# Altium footprint library distance_sensor_v2.PcbLib: 32 footprints (part 2 of 2)
Each footprint in its own frame and in the unit in brackets; x right, y up, seen from the top. Pads: shape width x height; smd on the part's side, far side on the other; paste and mask are expansions set on the pad; w line width, h text height; cw(c..) or ccw(c..) is an arc to the next point about the centre after c.
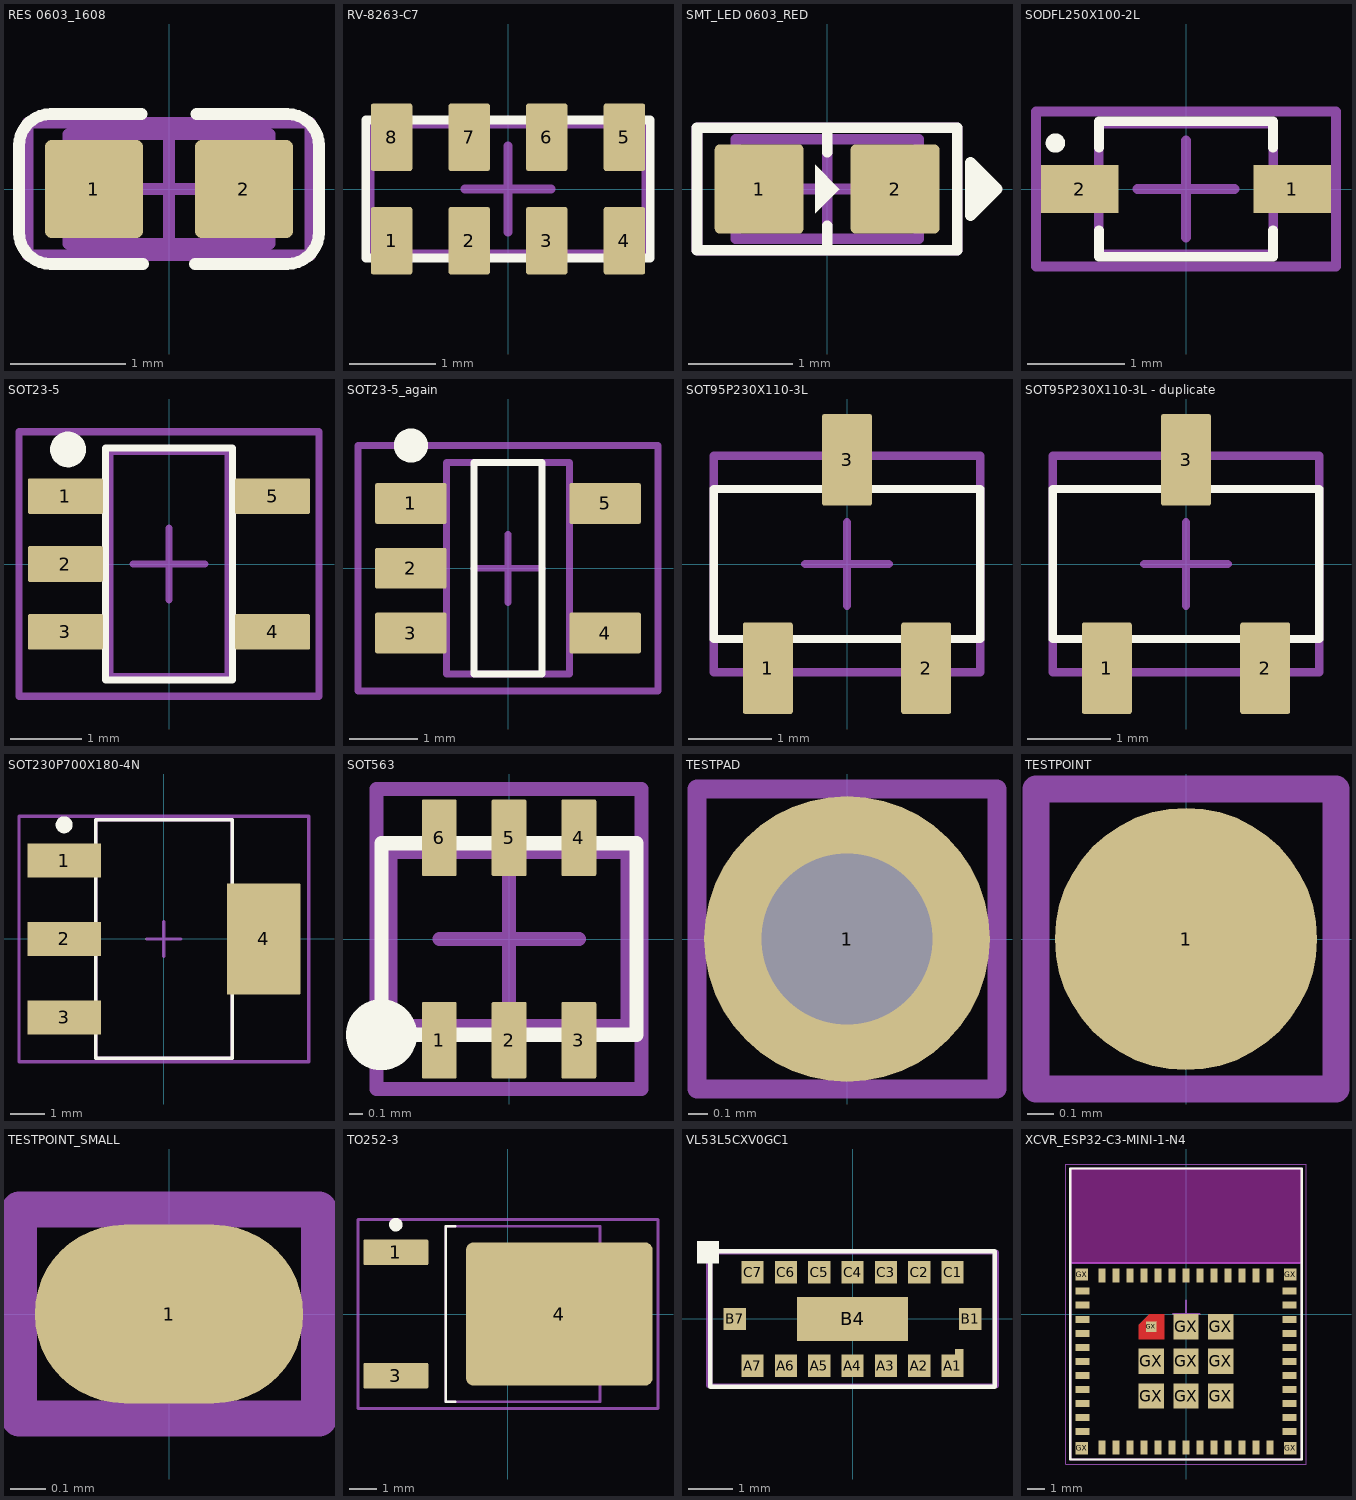
[diagram p1: the footprints below, top view; thin cyan lines are the x and y axes]

## RES 0603_1608 [mm] "Chip Resistor, 2-Leads, Body 1.60x0.80mm, IPC Medium Density"
height 0.45
pads (2):
  rrect12% 0.848x0.848 smd: 1(-0.65,0) 2(0.65,0)
Top Overlay:
  lines w0.102: -0.238,0.65 -1.025,0.65 ccw(c-1.025,0.375) -1.3,0.375 -1.3,-0.375 ccw(c-1.025,-0.375) -1.025,-0.65 -0.225,-0.65 ; 0.225,-0.65 1.025,-0.65 ccw(c1.025,-0.375) 1.3,-0.375 1.3,0.375 ccw(c1.025,0.375) 1.025,0.65 0.238,0.65
Top Assembly:
  lines w0.1: -0.875,-0.475 -0.875,0.475 0.875,0.475 0.875,-0.475 -0.875,-0.475
Top Courtyard:
  lines w0.102: -0.475,0 0.475,0 ; 0,-0.475 0,0.475 ; -1.225,-0.575 -1.225,0.575 1.225,0.575 1.225,-0.575 -1.225,-0.575
3D body "0603 resistor.STEP": height 0.45, standoff 0, extent -0.8,-0.4 0.8,0.4

## RV-8263-C7 [mm] "Real-Time Clock Module"
pads (8):
  rrect10% 0.48x0.78 smd mask+0.076: 1(-1.35,-0.6) 2(-0.45,-0.6) 3(0.45,-0.6) 4(1.35,-0.6) 5(1.35,0.6) 6(0.45,0.6) 7(-0.45,0.6) 8(-1.35,0.6)
Top Overlay:
  lines w0.102: -1.65,-0.8 1.65,-0.8 1.65,0.8 -1.65,0.8 -1.65,-0.8
Top Assembly:
  lines w0.102: -1.6,-0.75 1.6,-0.75 1.6,0.75 -1.6,0.75 -1.6,-0.75
Top Courtyard:
  lines w0.102: -0.5,0 0.5,0 ; 0,-0.5 0,0.5 ; -1.6,-0.75 1.6,-0.75 1.6,0.75 -1.6,0.75 -1.6,-0.75
3D body: height 0.8, standoff 0, extent -1.6,-0.75 1.6,0.75

## SMT_LED 0603_RED [mm] "Chip Diode, 2-Leads, Body 1.60x0.80mm, IPC Medium Density"
height 0.45
pads (2):
  rrect10% 0.85x0.85 smd: 1(-0.65,0) 2(0.65,0)
Top Overlay:
  region: -0.114,0.231 -0.114,-0.231 0.117,0
  region: -0.114,0.191
  region: 1.372,0.254 1.626,0 1.372,-0.254
  lines w0.102: 0,-0.584 0,-0.35 ; 0,0.35 0,0.584 ; -1.245,-0.584 -1.245,0.584 1.245,0.584 1.245,-0.584 -1.245,-0.584 ; 1.372,-0.254 1.626,0 1.372,0.254 1.372,-0.254
Top Assembly:
  lines w0.1: -0.875,-0.475 0.875,-0.475 0.875,0.475 -0.875,0.475 -0.875,-0.475
Top Courtyard:
  lines w0.102: -0.475,0 0.475,0 ; 0,-0.475 0,0.475 ; -1.245,-0.584 1.245,-0.584 1.245,0.584 -1.245,0.584 -1.245,-0.584
3D body "LED 0603 Base RED.STEP": height 0.28, standoff 0, extent -0.8,-0.4 0.8,0.4
3D body "LED 0603 Lens RED.STEP": height 0.53, standoff 0.18, extent -0.55,-0.4 0.55,0.4

## SODFL250X100-2L [mm] "SODFL, 2-Leads, Body 1.25x2.50mm, IPC High Density"
height 1
pads (2):
  rrect1% 0.8x0.5 smd: 1(1.1,0) 2(-1.1,0)
Top Overlay:
  circle w0.1: c-1.35,0.475 r0.05
  lines w0.102: -0.9,-0.426 -0.9,-0.7 0.9,-0.7 0.9,-0.426 ; -0.9,0.426 -0.9,0.7 0.9,0.7 0.9,0.426
Top Assembly:
  lines w0.102: -0.5,0 0.5,0 ; 0,-0.5 0,0.5 ; -1.55,-0.8 1.55,-0.8 1.55,0.8 -1.55,0.8 -1.55,-0.8
Top Courtyard:
  lines w0.1: -0.9,-0.675 0.9,-0.675 0.9,0.675 -0.9,0.675 -0.9,-0.675
3D body "SODFL250X100-2L.step": height 1, standoff 0, extent -1.25,-0.675 1.25,0.675

## SOT23-5 [mm] "SOT23, 5-Leads, Body 3.00x2.75mm, Pitch 0.95mm, IPC Medium Density"
height 1
pads (5):
  rrect10% 1.05x0.5 smd: 1(-1.45,0.95) 2(-1.45,0) 3(-1.45,-0.95) 4(1.45,-0.95) 5(1.45,0.95)
Top Overlay:
  circle w0.25: c-1.413,1.603 r0.125
  lines w0.102: -0.889,-1.626 0.889,-1.626 0.889,1.626 -0.889,1.626 -0.889,-1.626
Top Assembly:
  lines w0.102: -0.825,-1.575 -0.825,1.575 0.825,1.575 0.825,-1.575 -0.825,-1.575
Top Courtyard:
  lines w0.1: -0.5,0 0.5,0 ; 0,-0.5 0,0.5
  lines w0.102: -2.1,-1.85 -2.1,1.85 2.1,1.85 2.1,-1.85 -2.1,-1.85
3D body "SOT23-5.step": height 1, standoff 0, extent -1.5,-1.575 1.5,1.575

## SOT23-5_again [mm]
height 1.45
pads (5):
  rrect10% 1.05x0.6 smd: 1(-1.425,0.95) 2(-1.425,0) 3(-1.425,-0.95) 4(1.425,-0.95) 5(1.425,0.95)
Top Overlay:
  circle w0.25: c-1.425,1.8 r0.125
  lines w0.102: -0.5,-1.55 -0.5,1.55 0.5,1.55 0.5,-1.55 -0.5,-1.55
Top Assembly:
  lines w0.102: -0.9,-1.55 0.9,-1.55 0.9,1.55 -0.9,1.55 -0.9,-1.55
Top Courtyard:
  lines w0.1: -0.5,0 0.5,0 ; 0,-0.5 0,0.5
  lines w0.102: -2.2,-1.8 2.2,-1.8 2.2,1.8 -2.2,1.8 -2.2,-1.8
3D body "SOT23-5_again.step": height 1.45, standoff 0, extent -1.7,-1.55 1.7,1.55

## SOT95P230X110-3L [mm] "SOT23, 3-Leads, Body 2.90x2.30mm, Pitch 0.95mm, IPC High Density"
height 1.1
pads (3):
  rrect10% 0.6x1.1 smd: 1(-0.95,-1.25) 2(0.95,-1.25) 3(0,1.25)
Top Overlay:
  lines w0.102: -1.6,-0.9 -1.6,0.9 1.6,0.9 1.6,-0.9 -1.6,-0.9
Top Assembly:
  lines w0.1: -1.6,-0.9 1.6,-0.9 1.6,0.9 -1.6,0.9 -1.6,-0.9
Top Courtyard:
  lines w0.102: -0.5,0 0.5,0 ; 0,-0.5 0,0.5 ; -1.6,-1.3 1.6,-1.3 1.6,1.3 -1.6,1.3 -1.6,-1.3
3D body "SOT95P230X110-3L.step": height 1.1, standoff 0, extent -1.5,-1.3 1.5,1.3

## SOT95P230X110-3L - duplicate [mm] "SOT23, 3-Leads, Body 2.90x2.30mm, Pitch 0.95mm, IPC High Density"
height 1.1
pads (3):
  rrect10% 0.6x1.1 smd: 1(-0.95,-1.25) 2(0.95,-1.25) 3(0,1.25)
Top Overlay:
  lines w0.102: -1.6,-0.9 1.6,-0.9 1.6,0.9 -1.6,0.9 -1.6,-0.9
Top Assembly:
  lines w0.1: -1.6,-0.9 -1.6,0.9 1.6,0.9 1.6,-0.9 -1.6,-0.9
Top Courtyard:
  lines w0.102: -0.5,0 0.5,0 ; 0,-0.5 0,0.5 ; -1.6,-1.3 -1.6,1.3 1.6,1.3 1.6,-1.3 -1.6,-1.3
3D body "SOT95P230X110-3L.step": height 1.1, standoff 0, extent -1.5,-1.3 1.5,1.3

## SOT230P700X180-4N [mm] "SOT223, 4-Leads, Body 6.50x7.00mm (avg), Pitch 2.30mm, IPC Medium Density"
height 1.8
pads (4):
  rrect1% 2.15x1 smd: 1(-2.925,2.3) 2(-2.925,0) 3(-2.925,-2.3)
  rrect1% 2.15x3.25 smd: 4(2.925,0)
Top Overlay:
  circle w0.25: c-2.925,3.35 r0.125
  lines w0.102: -2,-3.5 -2,3.5 2,3.5 2,-3.5 -2,-3.5
Top Assembly:
  lines w0.102: -2,-3.5 -2,3.5 2,3.5 2,-3.5 -2,-3.5
Top Courtyard:
  lines w0.102: -0.5,0 0.5,0 ; 0,-0.5 0,0.5 ; -4.25,-3.6 -4.25,3.6 4.25,3.6 4.25,-3.6 -4.25,-3.6
3D body "SOT230P700X180-4N.step": height 1.8, standoff 0, extent -3.5,-3.35 3.5,3.35

## SOT563 [mm] "SOTFL, 6-Leads, Body 1.60x1.63mm, Pitch 0.50mm, IPC High Density"
height 0.6
pads (6):
  rrect10% 0.25x0.55 smd: 1(-0.5,-0.725) 2(0,-0.725) 3(0.5,-0.725) 4(0.5,0.725) 5(0,0.725) 6(-0.5,0.725)
Top Overlay:
  circle w0.406: c-0.914,-0.686 r0.051
  lines w0.102: -0.914,-0.686 -0.914,0.686 0.914,0.686 0.914,-0.686 -0.914,-0.686
Top Assembly:
  lines w0.102: -0.85,-0.625 -0.85,0.625 0.85,0.625 0.85,-0.625 -0.85,-0.625
Top Courtyard:
  lines w0.1: -0.5,0 0.5,0 ; 0,-0.5 0,0.5
  lines w0.102: -0.95,-1.075 -0.95,1.075 0.95,1.075 0.95,-1.075 -0.95,-1.075
3D body "SOT563.step": height 0.6, standoff 0, extent -0.848,-0.812 0.848,0.813

## TESTPAD [mm]
pads (1):
  round 1.5 hole 0.9: 1(0,0)
Top Courtyard:
  lines w0.102: -0.254,0 0.254,0 ; 0,-0.254 0,0.254 ; -0.787,-0.787 -0.787,0.787 0.787,0.787 0.787,-0.787 -0.787,-0.787

## TESTPOINT [mm]
pads (1):
  round 1 smd paste-900: 1(0,0)
Top Courtyard:
  lines w0.102: -0.191,0 0.191,0 ; 0,-0.191 0,0.191 ; -0.572,-0.572 0.572,-0.572 0.572,0.572 -0.572,0.572 -0.572,-0.572

## TESTPOINT_SMALL [mm]
pads (1):
  oval 0.75x0.5 smd paste-900: 1(0,0)
Top Courtyard:
  region: -0.305,0.229
  lines w0.102: -0.165,0 0.165,0 ; 0,-0.165 0,0.165 ; -0.419,-0.292 0.419,-0.292 0.419,0.292 -0.419,0.292 -0.419,-0.292

## TO252-3 [mm] "D-PAK, 3-Pads, Body 5.95x6.62mm (max), IPC Medium Density"
height 2.32
pads (3):
  rrect10% 2.4x0.95 smd: 1(-4.15,2.28) 3(-4.15,-2.28)
  rrect10% 6.9x5.3 smd: 4(1.9,0)
Top Overlay:
  circle w0.25: c-4.15,3.305 r0.125
  lines w0.102: -1.95,-3.25 -2.3,-3.25 -2.3,3.25 -1.95,3.25
Top Assembly:
  lines w0.102: -2.3,-3.25 -2.3,3.25 3.4,3.25 3.4,-3.25 -2.3,-3.25
Top Courtyard:
  lines w0.1: -0.5,0 0.5,0 ; 0,-0.5 0,0.5
  lines w0.102: -5.55,-3.5 -5.55,3.5 5.55,3.5 5.55,-3.5 -5.55,-3.5
3D body "TO252-3.step": height 2.32, standoff 0, extent -4.6,-3.25 5.1,3.25

## VL53L5CXV0GC1 [mm]
pads (18):
  rect 0.5x0.5 smd mask+0.076: A1(2.25,-1.05) A3(0.75,-1.05) A4(0,-1.05) A5(-0.75,-1.05) B1(2.65,0) B7(-2.65,0) C2(1.5,1.05) C3(0.75,1.05) C4(0,1.05) C5(-0.75,1.05)
  rect 0.2x0.15 smd mask+0.076: A1(2.4,-0.75)
  rect 0.5x0.5 smd mask+0: A2(1.5,-1.05) A6(-1.5,-1.05) A7(-2.25,-1.05) C1(2.25,1.05) C6(-1.5,1.05) C7(-2.25,1.05)
  rect 2.5x1 smd mask+0: B4(0,0)
Top Overlay:
  rectangle: -3.5,1.25 -3,1.75
  lines w0.102: -3.2,-1.525 -3.2,1.525 3.2,1.525 3.2,-1.525 -3.2,-1.525
Top Assembly:
  lines w0.1: -3.2,-1.501 -3.2,1.502 3.2,1.502 3.2,-1.501 -3.2,-1.501
Top Courtyard:
  lines w0.1: -3.25,-1.5 -3.25,1.5 3.25,1.5 3.25,-1.5 -3.25,-1.5
  lines w0.102: -0.381,0 0.381,0 ; 0,-0.381 0,0.381
3D body "VL53L5CXV0GC_1.stp": height 1.53, standoff 0.03, extent -3.208,-1.515 3.192,1.515

## XCVR_ESP32-C3-MINI-1-N4 [mm]
height 2.55
pads (61):
  rect 0.8x0.4 smd: 3(-5.9,-0.3) 4(-5.9,-1.1) 5(-5.9,-1.9) 6(-5.9,-2.7) 7(-5.9,-3.5) 8(-5.9,-4.3) 9(-5.9,-5.1) 10(-5.9,-5.9) 25(5.9,-6.7) 26(5.9,-5.9) 27(5.9,-5.1) 28(5.9,-4.3) 29(5.9,-3.5) 30(5.9,-2.7) 31(5.9,-1.9) 32(5.9,-1.1) 33(5.9,-0.3) 34(5.9,0.5) 35(5.9,1.3)
  rect 0.4x0.8 smd: 12(-4.8,-7.6) 13(-4,-7.6) 15(-2.4,-7.6) 16(-1.6,-7.6) 17(-0.8,-7.6) 18(0,-7.6) 19(0.8,-7.6) 20(1.6,-7.6) 21(2.4,-7.6) 22(3.2,-7.6) 23(4,-7.6) 24(4.8,-7.6)
  rect 0.7x0.7 smd mask+0.05: GX(-5.95,-7.65) GX(-5.95,2.25) GX(5.95,-7.65) GX(5.95,2.25)
  rect 0.8x0.4 smd mask+0.05: GX(-5.9,-6.7) GX(-5.9,0.5) GX(-5.9,1.3)
  rect 0.4x0.8 smd mask+0.05: GX(-4.8,2.2) GX(-4,2.2) GX(-3.2,-7.6) GX(-3.2,2.2) GX(-2.4,2.2) GX(-1.6,2.2) GX(-0.8,2.2) GX(0,2.2) GX(0.8,2.2) GX(1.6,2.2) GX(2.4,2.2) GX(3.2,2.2) GX(4,2.2) GX(4.8,2.2)
  rect 1.45x1.45 smd mask+0: GX(-1.975,-4.675) GX(-1.975,-2.7) GX(0,-4.675) GX(0,-2.7) GX(0,-0.725) GX(1.975,-4.675) GX(1.975,-2.7) GX(1.975,-0.725)
  rect 0.6x0.6 smd paste-1 mask+0: GX(-1.975,-0.725)
Top Layer:
  region: -1.25,-1.45 -2.7,-1.45 -2.7,-0.6 -2.1,0 -1.25,0
Top Overlay:
  lines w0.127: -6.6,-8.3 6.6,-8.3 6.6,8.3 -6.6,8.3 -6.6,-8.3
Top Paste:
  region: -1.25,-1.45 -2.7,-1.45 -2.7,-0.6 -2.1,0 -1.25,0
Keep-Out Layer:
  region: 6.6,2.9 -6.6,2.9 -6.6,8.3 6.6,8.3
  region: 6.6,2.9 -6.6,2.9 -6.6,8.3 6.6,8.3
Top Assembly:
  lines w0.127: -6.6,2.9 6.6,2.9 ; -6.6,2.9 -6.6,8.3 6.6,8.3 6.6,2.9 ; -6.6,2.9 -6.6,-8.3 6.6,-8.3 6.6,2.9
Top Courtyard:
  lines w0.05: -6.85,-8.55 6.85,-8.55 6.85,8.55 -6.85,8.55 -6.85,-8.55
  lines w0.102: -0.759,-0.001 0.765,-0.001 ; 0,-0.762 0,0.762
3D body "step_temp.STEP": height 2.55, standoff 0, extent -6.6,-8.3 6.6,8.3